# Altium footprint library Miscellaneous Devices LC.PcbLib: 733 footprints (part 35 of 46)
Each footprint in its own frame and in the unit in brackets; x right, y up, seen from the top. Pads: shape width x height; smd on the part's side, far side on the other; paste and mask are expansions set on the pad; w line width, h text height; cw(c..) or ccw(c..) is an arc to the next point about the centre after c.
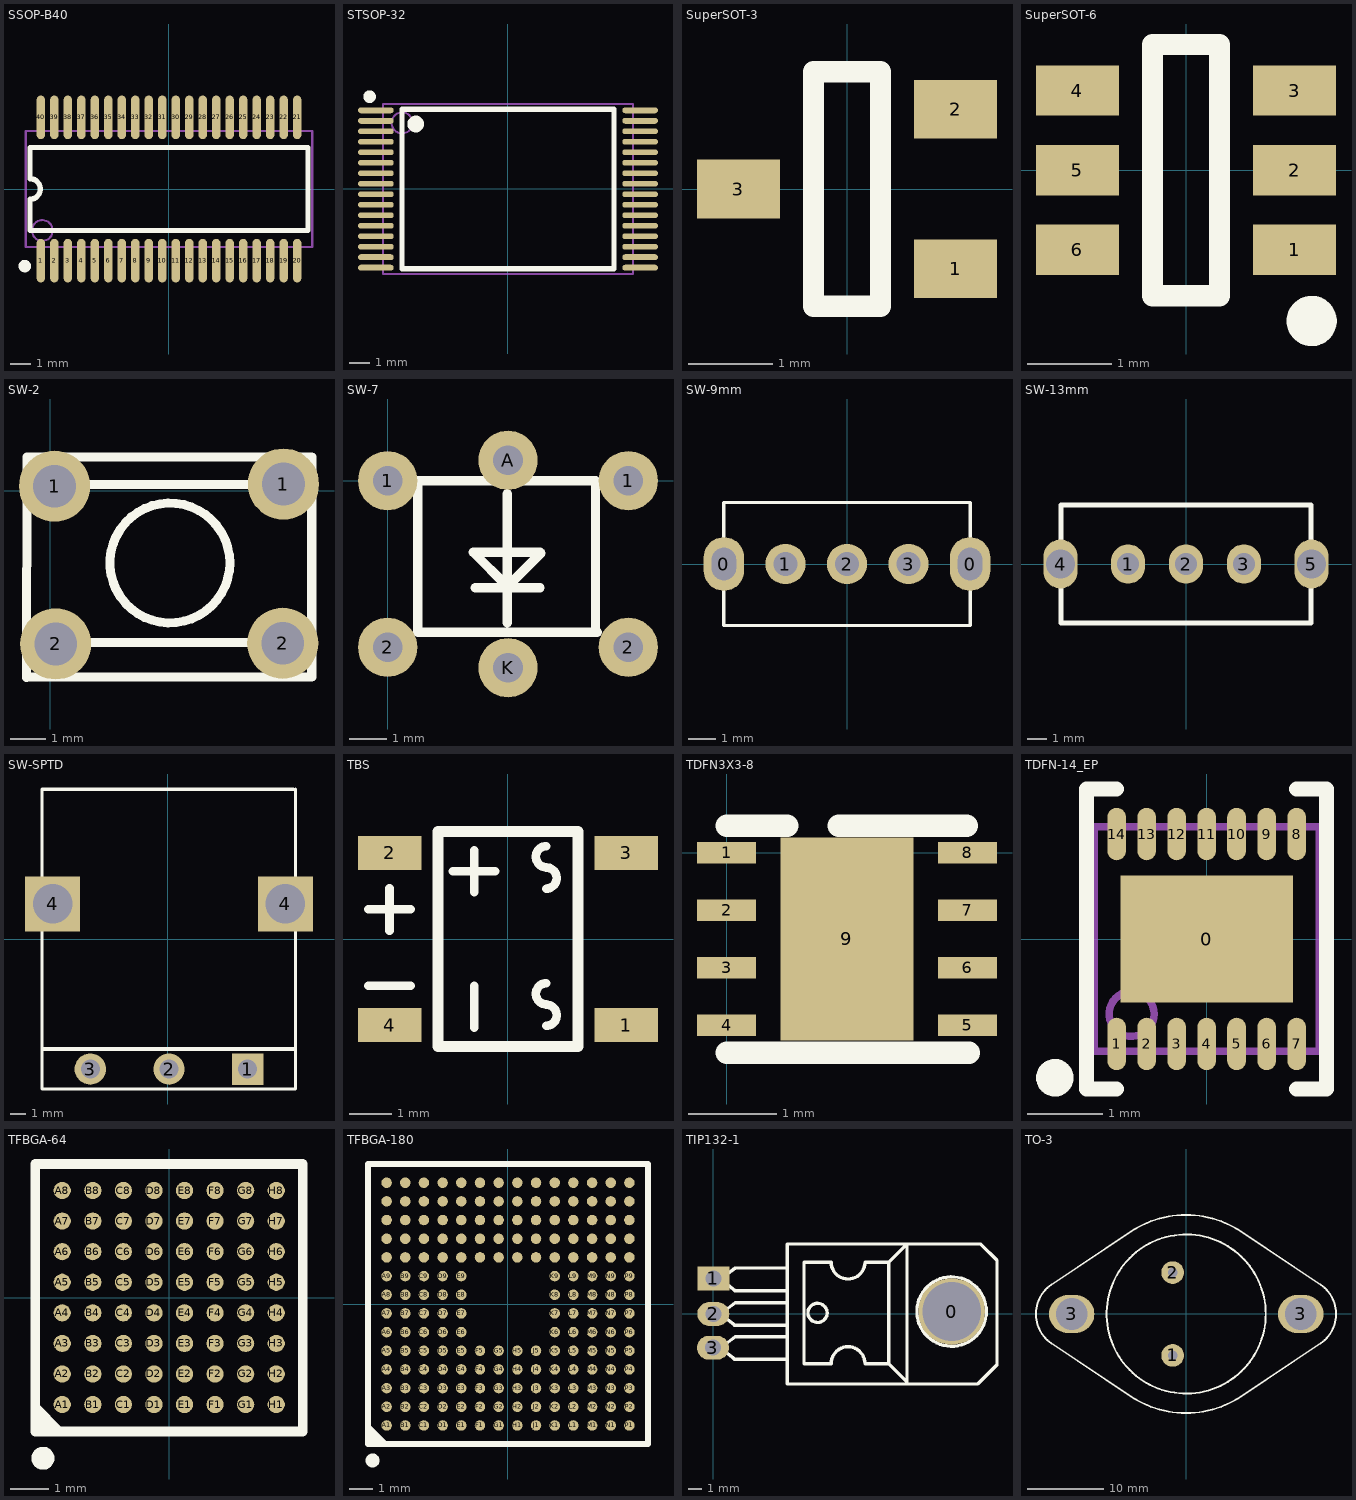
[diagram p34: the footprints below, top view; thin cyan lines are the x and y axes]

## SSOP-B40 [mm]
pads (40):
  oval 0.4x2.1 smd mask+0.051: 1(-6.175,-3.45) 2(-5.525,-3.45) 3(-4.875,-3.45) 4(-4.225,-3.45) 5(-3.575,-3.45) 6(-2.925,-3.45) 7(-2.275,-3.45) 8(-1.625,-3.45) 9(-0.975,-3.45) 10(-0.325,-3.45) 11(0.325,-3.45) 12(0.975,-3.45) 13(1.625,-3.45) 14(2.275,-3.45) 15(2.925,-3.45) 16(3.575,-3.45) 17(4.225,-3.45) 18(4.875,-3.45) 19(5.525,-3.45) 20(6.175,-3.45) 21(6.175,3.45) 22(5.525,3.45) 23(4.875,3.45) 24(4.225,3.45) 25(3.575,3.45) 26(2.925,3.45) 27(2.275,3.45) 28(1.625,3.45) 29(0.975,3.45) 30(0.325,3.45) 31(-0.325,3.45) 32(-0.975,3.45) 33(-1.625,3.45) 34(-2.275,3.45) 35(-2.925,3.45) 36(-3.575,3.45) 37(-4.225,3.45) 38(-4.875,3.45) 39(-5.525,3.45) 40(-6.175,3.45)
Top Overlay:
  circle w0.3: c-6.947,-3.715 r0.15
  lines w0.254: -6.7,-2 6.7,-2 6.7,2 -6.7,2 -6.7,0.5 cw(c-6.7,0) -6.7,-0.5 -6.7,-2
Mechanical 13:
  circle w0.1: c-6.1,-2 r0.5
  lines w0.1: -6.9,-2.8 -6.9,2.8 6.9,2.8 6.9,-2.8 -6.9,-2.8

## STSOP-32 [mm]
pads (32):
  oval 1.7x0.28 smd mask+0.051: 1(-6.3,3.75) 2(-6.3,3.25) 3(-6.3,2.75) 4(-6.3,2.25) 5(-6.3,1.75) 6(-6.3,1.25) 7(-6.3,0.75) 8(-6.3,0.25) 9(-6.3,-0.25) 10(-6.3,-0.75) 11(-6.3,-1.25) 12(-6.3,-1.75) 13(-6.3,-2.25) 14(-6.3,-2.75) 15(-6.3,-3.25) 16(-6.3,-3.75) 17(6.3,-3.75) 18(6.3,-3.25) 19(6.3,-2.75) 20(6.3,-2.25) 21(6.3,-1.75) 22(6.3,-1.25) 23(6.3,-0.75) 24(6.3,-0.25) 25(6.3,0.25) 26(6.3,0.75) 27(6.3,1.25) 28(6.3,1.75) 29(6.3,2.25) 30(6.3,2.75) 31(6.3,3.25) 32(6.3,3.75)
Top Overlay:
  circle w0.4: c-4.4,3.1 r0.2
  circle w0.3: c-6.6,4.4 r0.15
  lines w0.254: -5.05,-3.8 -5.05,3.8 5.05,3.8 5.05,-3.8 -5.05,-3.8
Mechanical 13:
  circle w0.1: c-5.05,3.15 r0.5
  lines w0.1: -5.95,-4.05 -5.95,4.05 5.95,4.05 5.95,-4.05 -5.95,-4.05

## SuperSOT-3 [mm] "= SSOT-3"
pads (3):
  rect 0.99x0.7 smd: 1(1.295,-0.95) 2(1.295,0.95) 3(-1.295,0)
Top Overlay:
  lines w0.254: -0.4,-1.4 -0.4,1.4 0.4,1.4 0.4,-1.4 -0.4,-1.4

## SuperSOT-6 [mm] "= SSOT-6"
pads (6):
  rect 0.99x0.6 smd: 1(1.295,-0.95) 2(1.295,0) 3(1.295,0.95) 4(-1.295,0.95) 5(-1.295,0) 6(-1.295,-0.95)
Top Overlay:
  circle w0.3: c1.5,-1.8 r0.15
  lines w0.254: -0.4,-1.5 0.4,-1.5 0.4,1.5 -0.4,1.5 -0.4,-1.5

## SW-2 [mm]
pads (4):
  round 2 hole 1.2: 1(0.127,0.127) 1(6.569,0.186) 2(0.159,-4.314) 2(6.549,-4.294)
Top Overlay:
  circle w0.254: c3.373,-2.034 r1.686
  lines w0.254: -0.661,-5.254 -0.651,0.941 7.365,0.941 7.365,-5.25 -0.657,-5.25 ; 0.238,0.179 6.842,0.179 ; 0.322,-4.274 6.799,-4.274

## SW-7 [mm]
pads (6):
  round 1.6 hole 0.8: 1(0,0) 1(6.5,0) 2(0,-4.5) 2(6.5,-4.5) A(3.25,0.55) K(3.25,-5.05)
Top Overlay:
  lines w0.254: 2.362,-2.896 4.115,-2.896 ; 3.226,-3.835 3.226,-0.356 ; 3.226,-2.87 4.14,-1.956 4.115,-1.93 3.988,-1.93 2.311,-1.93 3.226,-2.845 ; 5.613,-4.039 5.613,0 0.813,0 0.813,-4.089 5.664,-4.089

## SW-9mm [mm]
pads (5):
  oval 1.5x2 hole 1.2 slot 0.9 at 0 deg: 0(-4.572,0) 0(4.572,0)
  round 1.5 hole 0.9: 1(-2.286,0) 2(0,0) 3(2.286,0)
Top Overlay:
  lines w0.127: -4.572,-1.016 -4.572,-2.286 0,-2.286 4.572,-2.286 4.572,-1.016 ; -4.572,1.016 -4.572,2.286 0,2.286 4.572,2.286 4.572,1.016

## SW-13mm [mil]
pads (5):
  oval 70x80 hole 45: 1(-118.11,0) 2(0,0) 3(118.11,0)
  oval 70x100 hole 60: 4(-255.91,0) 5(255.91,0)
Top Overlay:
  lines w10: -255,-120 255,-120 255,120 -255,120 -255,-120

## SW-SPTD [mm]
pads (5):
  rect 2x2 hole 1.2: 1(5.093,-8.239)
  round 2 hole 1.2: 2(0.093,-8.239) 3(-4.907,-8.239)
  rect 3.5x3.5 hole 2.5: 4(-7.307,2.261) 4(7.493,2.261)
Top Overlay:
  lines w0.2: -7.988,9.541 8.014,9.541 ; -7.988,9.561 -7.988,-9.509 8.093,-9.509 ; 8.141,-9.509 8.141,9.561
  lines w0.254: -7.907,-6.969 8.093,-6.969

## TBS [mm]
pads (4):
  rect 1.5x0.8 smd: 1(2.794,-2.032) 2(-2.794,2.032) 3(2.794,2.032) 4(-2.794,-2.032)
Top Overlay:
  lines w0.203: -3.3,-1.1 -2.3,-1.1 ; -3.3,0.7 -2.3,0.7 ; -2.8,0.2 -2.8,1.2 ; -1.3,1.6 -0.3,1.6 ; -0.8,-2.1 -0.8,-1.1 ; -0.8,1.1 -0.8,2.1 ; 0.9,-2.05 ccw(c0.9,-1.8) 0.9,-1.55 ; 0.9,1.19 ccw(c0.9,1.44) 0.9,1.69 ; 0.908,-1.545 cw(c0.908,-1.295) 0.908,-1.045 ; 0.908,1.695 cw(c0.908,1.945) 0.908,2.195
  lines w0.254: -1.651,-2.54 1.651,-2.54 1.651,2.54 -1.651,2.54 -1.651,-2.54

## TDFN3X3-8 [mm]
pads (9):
  rect 0.67x0.24 smd: 1(0,0) 2(0,-0.65) 3(0,-1.3) 4(0,-1.95) 5(2.725,-1.95) 6(2.725,-1.3) 7(2.725,-0.65) 8(2.725,0)
  rect 1.5x2.3 smd: 9(1.362,-0.975)
Top Overlay:
  lines w0.254: 0,-2.261 2.743,-2.261 ; 0,0.305 0.686,0.305 ; 1.27,0.305 2.718,0.305

## TDFN-14_EP [mm]
pads (15):
  rect 2.3x1.7 smd mask+0.051: 0(0,0)
  oval 0.25x0.7 smd mask+0.051: 1(-1.2,-1.4) 2(-0.8,-1.4) 3(-0.4,-1.4) 4(0,-1.4) 5(0.4,-1.4) 6(0.8,-1.4) 7(1.2,-1.4) 8(1.2,1.4) 9(0.8,1.4) 10(0.4,1.4) 11(0,1.4) 12(-0.4,1.4) 13(-0.8,1.4) 14(-1.2,1.4)
Top Overlay:
  circle w0.25: c-2.025,-1.85 r0.125
  lines w0.2: -1.2,-2 -1.6,-2 -1.6,2 -1.2,2 ; 1.2,-2 1.6,-2 1.6,2 1.2,2
Mechanical 13:
  circle w0.1: c-1,-1 r0.3
  lines w0.1: -1.5,-1.5 -1.5,1.5 1.5,1.5 1.5,-1.5 -1.5,-1.5

## TFBGA-64 [mm]
pads (64):
  round 0.45 smd mask+0.051: A1(-2.8,-2.8) A2(-2.8,-2) A3(-2.8,-1.2) A4(-2.8,-0.4) A5(-2.8,0.4) A6(-2.8,1.2) A7(-2.8,2) A8(-2.8,2.8) B1(-2,-2.8) B2(-2,-2) B3(-2,-1.2) B4(-2,-0.4) B5(-2,0.4) B6(-2,1.2) B7(-2,2) B8(-2,2.8) C1(-1.2,-2.8) C2(-1.2,-2) C3(-1.2,-1.2) C4(-1.2,-0.4) C5(-1.2,0.4) C6(-1.2,1.2) C7(-1.2,2) C8(-1.2,2.8) D1(-0.4,-2.8) D2(-0.4,-2) D3(-0.4,-1.2) D4(-0.4,-0.4) D5(-0.4,0.4) D6(-0.4,1.2) D7(-0.4,2) D8(-0.4,2.8) E1(0.4,-2.8) E2(0.4,-2) E3(0.4,-1.2) E4(0.4,-0.4) E5(0.4,0.4) E6(0.4,1.2) E7(0.4,2) E8(0.4,2.8) F1(1.2,-2.8) F2(1.2,-2) F3(1.2,-1.2) F4(1.2,-0.4) F5(1.2,0.4) F6(1.2,1.2) F7(1.2,2) F8(1.2,2.8) G1(2,-2.8) G2(2,-2) G3(2,-1.2) G4(2,-0.4) G5(2,0.4) G6(2,1.2) G7(2,2) G8(2,2.8) H1(2.8,-2.8) H2(2.8,-2) H3(2.8,-1.2) H4(2.8,-0.4) H5(2.8,0.4) H6(2.8,1.2) H7(2.8,2) H8(2.8,2.8)
Top Overlay:
  circle w0.3: c-3.306,-4.206 r0.15
  region: -3.456,-2.756 -2.756,-3.456 -3.456,-3.456
  lines w0.254: -3.506,-3.506 3.494,-3.506 3.494,3.494 -3.506,3.494 -3.506,-3.506

## TFBGA-180 [mm]
pads (180):
  round 0.45 smd mask+0.051: A1(-5.2,-5.2) A2(-5.2,-4.4) A3(-5.2,-3.6) A4(-5.2,-2.8) A5(-5.2,-2) A6(-5.2,-1.2) A7(-5.2,-0.4) A8(-5.2,0.4) A9(-5.2,1.2) A10(-5.2,2) A11(-5.2,2.8) A12(-5.2,3.6) A13(-5.2,4.4) A14(-5.2,5.2) B1(-4.4,-5.2) B2(-4.4,-4.4) B3(-4.4,-3.6) B4(-4.4,-2.8) B5(-4.4,-2) B6(-4.4,-1.2) B7(-4.4,-0.4) B8(-4.4,0.4) B9(-4.4,1.2) B10(-4.4,2) B11(-4.4,2.8) B12(-4.4,3.6) B13(-4.4,4.4) B14(-4.4,5.2) C1(-3.6,-5.2) C2(-3.6,-4.4) C3(-3.6,-3.6) C4(-3.6,-2.8) C5(-3.6,-2) C6(-3.6,-1.2) C7(-3.6,-0.4) C8(-3.6,0.4) C9(-3.6,1.2) C10(-3.6,2) C11(-3.6,2.8) C12(-3.6,3.6) C13(-3.6,4.4) C14(-3.6,5.2) D1(-2.8,-5.2) D2(-2.8,-4.4) D3(-2.8,-3.6) D4(-2.8,-2.8) D5(-2.8,-2) D6(-2.8,-1.2) D7(-2.8,-0.4) D8(-2.8,0.4) D9(-2.8,1.2) D10(-2.8,2) D11(-2.8,2.8) D12(-2.8,3.6) D13(-2.8,4.4) D14(-2.8,5.2) E1(-2,-5.2) E2(-2,-4.4) E3(-2,-3.6) E4(-2,-2.8) E5(-2,-2) E6(-2,-1.2) E7(-2,-0.4) E8(-2,0.4) E9(-2,1.2) E10(-2,2) E11(-2,2.8) E12(-2,3.6) E13(-2,4.4) E14(-2,5.2) F1(-1.2,-5.2) F2(-1.2,-4.4) F3(-1.2,-3.6) F4(-1.2,-2.8) F5(-1.2,-2) F10(-1.2,2) F11(-1.2,2.8) F12(-1.2,3.6) F13(-1.2,4.4) F14(-1.2,5.2) G1(-0.4,-5.2) G2(-0.4,-4.4) G3(-0.4,-3.6) G4(-0.4,-2.8) G5(-0.4,-2) G10(-0.4,2) G11(-0.4,2.8) G12(-0.4,3.6) G13(-0.4,4.4) G14(-0.4,5.2) H1(0.4,-5.2) H2(0.4,-4.4) H3(0.4,-3.6) H4(0.4,-2.8) H5(0.4,-2) H10(0.4,2) H11(0.4,2.8) H12(0.4,3.6) H13(0.4,4.4) H14(0.4,5.2) J1(1.2,-5.2) J2(1.2,-4.4) J3(1.2,-3.6) J4(1.2,-2.8) J5(1.2,-2) J10(1.2,2) J11(1.2,2.8) J12(1.2,3.6) J13(1.2,4.4) J14(1.2,5.2) K1(2,-5.2) K2(2,-4.4) K3(2,-3.6) K4(2,-2.8) K5(2,-2) K6(2,-1.2) K7(2,-0.4) K8(2,0.4) K9(2,1.2) K10(2,2) K11(2,2.8) K12(2,3.6) K13(2,4.4) K14(2,5.2) L1(2.8,-5.2) L2(2.8,-4.4) L3(2.8,-3.6) L4(2.8,-2.8) L5(2.8,-2) L6(2.8,-1.2) L7(2.8,-0.4) L8(2.8,0.4) L9(2.8,1.2) L10(2.8,2) L11(2.8,2.8) L12(2.8,3.6) L13(2.8,4.4) L14(2.8,5.2) M1(3.6,-5.2) M2(3.6,-4.4) M3(3.6,-3.6) M4(3.6,-2.8) M5(3.6,-2) M6(3.6,-1.2) M7(3.6,-0.4) M8(3.6,0.4) M9(3.6,1.2) M10(3.6,2) M11(3.6,2.8) M12(3.6,3.6) M13(3.6,4.4) M14(3.6,5.2) N1(4.4,-5.2) N2(4.4,-4.4) N3(4.4,-3.6) N4(4.4,-2.8) N5(4.4,-2) N6(4.4,-1.2) N7(4.4,-0.4) N8(4.4,0.4) N9(4.4,1.2) N10(4.4,2) N11(4.4,2.8) N12(4.4,3.6) N13(4.4,4.4) N14(4.4,5.2) P1(5.2,-5.2) P2(5.2,-4.4) P3(5.2,-3.6) P4(5.2,-2.8) P5(5.2,-2) P6(5.2,-1.2) P7(5.2,-0.4) P8(5.2,0.4) P9(5.2,1.2) P10(5.2,2) P11(5.2,2.8) P12(5.2,3.6) P13(5.2,4.4) P14(5.2,5.2)
Top Overlay:
  circle w0.3: c-5.8,-6.7 r0.15
  region: -5.95,-5.15 -5.15,-5.95 -5.95,-5.95
  lines w0.254: -6,-6 6,-6 6,6 -6,6 -6,-6

## TIP132-1 [mm]
pads (4):
  round 5 hole 4.4: 0(17.882,0.178)
  rect 2.4x1.8 hole 1.2: 1(0,2.667)
  oval 2.4x1.8 hole 1.2: 2(0,0) 3(-0.025,-2.54)
Top Overlay:
  circle w0.254: c7.823,0.076 r0.718
  circle w0.254: c17.882,0.178 r2.6
  lines w0.254: 1.056,-2.946 1.637,-3.416 ; 1.056,-0.394 1.637,-0.864 ; 1.056,2.21 1.637,1.74 ; 1.102,-2.125 1.637,-1.716 5.537,-1.716 ; 1.102,0.427 1.637,0.836 5.537,0.836 ; 1.102,3.031 1.637,3.44 5.537,3.44 ; 1.574,-3.39 ccw(c1.637,-3.327) 1.637,-3.416 ; 1.574,-0.837 ccw(c1.637,-0.774) 1.637,-0.864 ; 1.574,1.766 ccw(c1.637,1.83) 1.637,1.74 ; 5.537,-3.416 1.637,-3.416 ; 5.537,-0.864 1.637,-0.864 ; 5.537,1.74 1.637,1.74 ; 14.513,5.242 13.157,3.886 ; 14.537,5.098 14.537,0.076 14.537,-5.148 ccw(c14.455,-5.148) 14.513,-5.09 13.157,-3.734 ; 13.157,-3.734 13.157,3.886 ; 13.157,-3.734 11.379,-3.734 ccw(c10.109,-3.734) 10.109,-2.464 ccw(c10.109,-3.734) 8.839,-3.734 6.807,-3.734 6.807,3.886 8.839,3.886 ccw(c10.109,3.886) 10.109,2.616 ccw(c10.109,3.886) 11.379,3.886 13.157,3.886 ; 5.537,-5.258 5.537,5.242 20.056,5.242 21.287,4.011 21.287,-3.833 19.863,-5.258 5.537,-5.258

## TO-3 [mm]
pads (4):
  round 3 hole 1.3: 1(-1.778,-5.461) 2(-1.778,5.461)
  oval 6x5 hole 4.2: 3(-15.113,0) 3(15.113,0)
Top Overlay:
  circle w0.254: c0,0 r10.5
  lines w0.254: -19.82,-0.051 ccw(c-15.22,-0.051) -17.773,-3.877 -7.246,-10.902 ccw(c-0.03,-0.089) -0.03,-13.089 -0.02,-13.089 ccw(c-0.02,-0.089) 7.196,-10.902 17.723,-3.877 ccw(c15.17,-0.051) 19.77,-0.051 19.77,0.051 ccw(c15.17,0.051) 17.723,3.877 7.196,10.902 ccw(c-0.02,0.089) -0.02,13.089 -0.03,13.089 ccw(c-0.03,0.089) -7.246,10.902 -17.773,3.877 ccw(c-15.22,0.051) -19.82,0.051 -19.82,-0.051
3D body "User Library-TO-3_Long.STEP": height 8.5, standoff -12, extent -19.757,-13.089 19.833,13.089